# Altium footprint library PSU_lib.PcbLib: 108 footprints (part 5 of 7)
Each footprint in its own frame and in the unit in brackets; x right, y up, seen from the top. Pads: shape width x height; smd on the part's side, far side on the other; paste and mask are expansions set on the pad; w line width, h text height; cw(c..) or ccw(c..) is an arc to the next point about the centre after c.
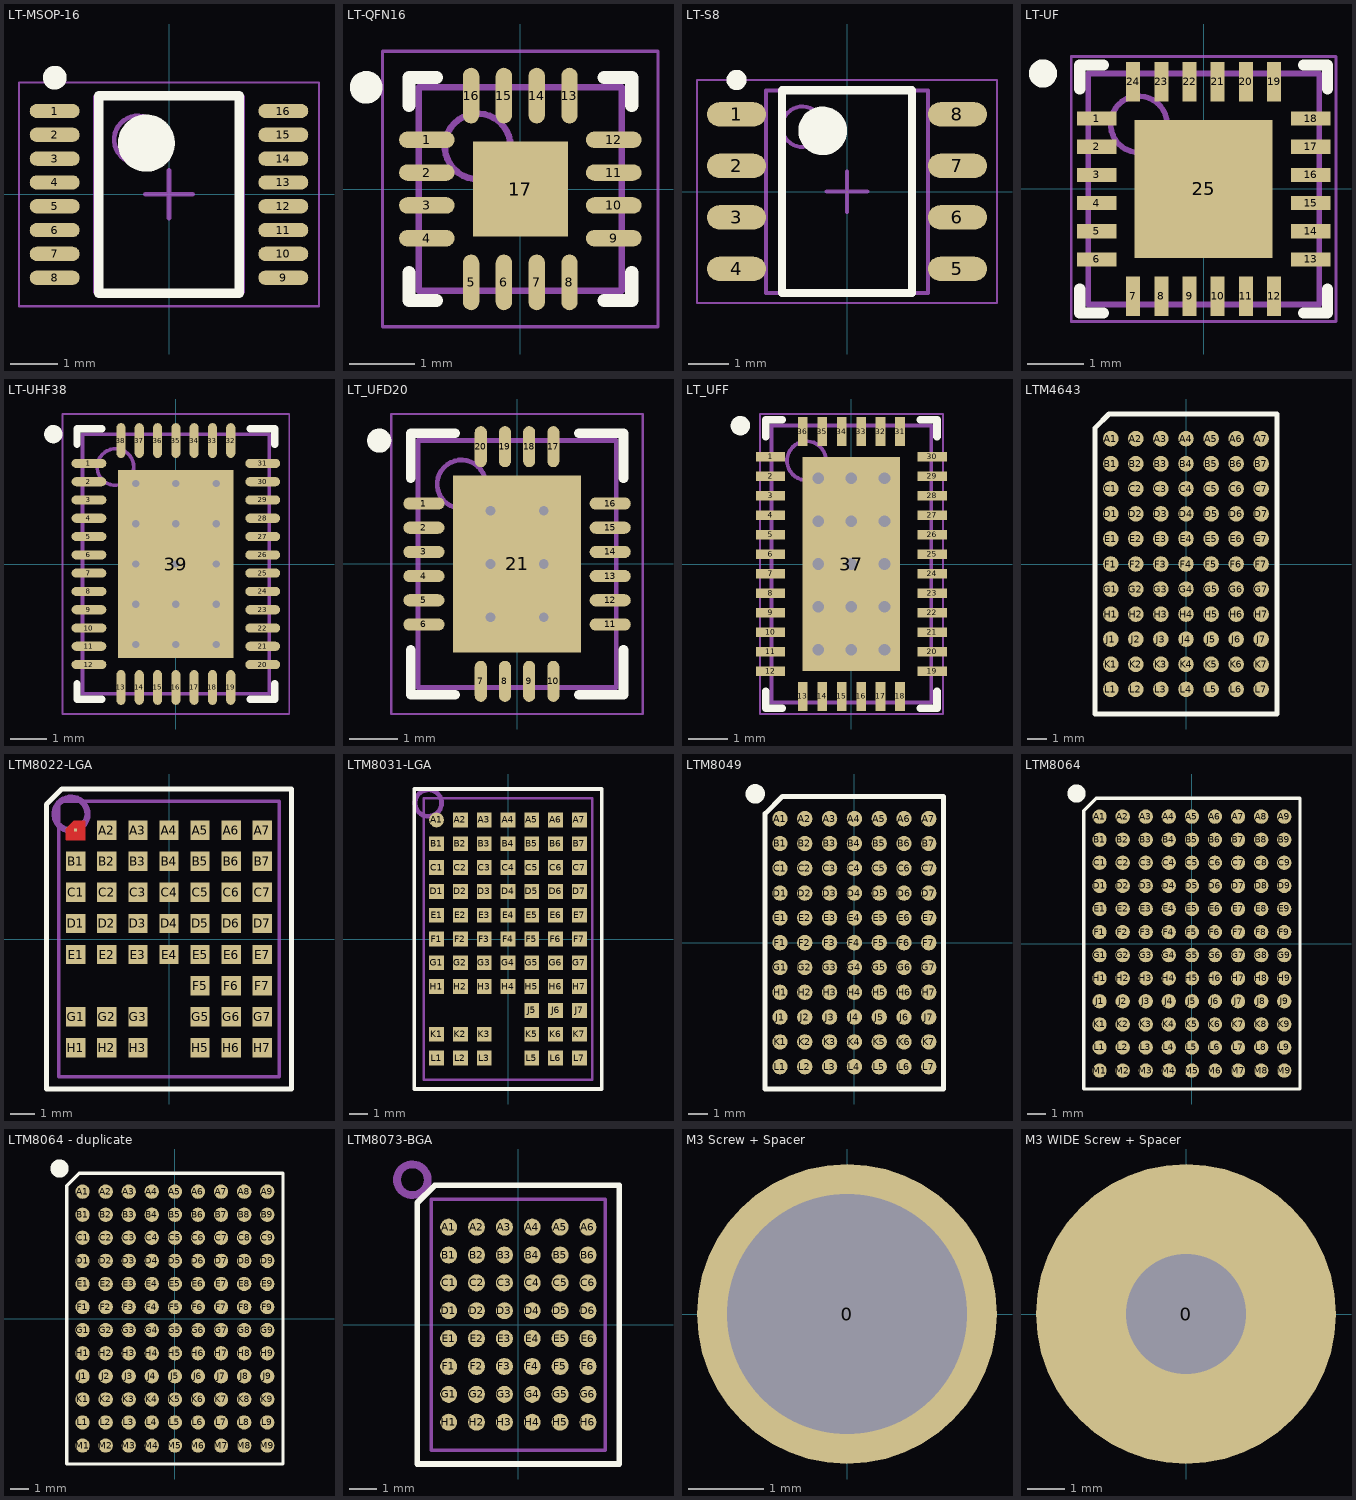
[diagram p4: the footprints below, top view; thin cyan lines are the x and y axes]

## LT-MSOP-16 [mm] "TSSOP, 16-Leads, Body 4,04x3,00mm, Pitch 0,50mm, IPC Medium Density"
height 1.1
pads (16):
  oval 1.05x0.3 smd: 1(-2.4,1.75) 2(-2.4,1.25) 3(-2.4,0.75) 4(-2.4,0.25) 5(-2.4,-0.25) 6(-2.4,-0.75) 7(-2.4,-1.25) 8(-2.4,-1.75) 9(2.4,-1.75) 10(2.4,-1.25) 11(2.4,-0.75) 12(2.4,-0.25) 13(2.4,0.25) 14(2.4,0.75) 15(2.4,1.25) 16(2.4,1.75)
Top Overlay:
  circle w0.25: c-2.4,2.45 r0.125
  circle w0.6: c-0.475,1.075 r0.3
  lines w0.2: -1.475,-2.075 -1.475,2.075 1.475,2.075 1.475,-2.075 -1.475,-2.075
Mechanical 13:
  circle w0.1: c-0.65,1.15 r0.5
  lines w0.1: -1.55,-2.05 -1.55,2.05 1.55,2.05 1.55,-2.05 -1.55,-2.05
Mechanical 15:
  lines w0.05: -3.15,-2.35 -3.15,2.35 3.15,2.35 3.15,-2.35 -3.15,-2.35
  lines w0.1: -0.5,0 0.5,0 ; 0,-0.5 0,0.5
3D body: height 1.1, standoff 0.05, extent -1.55,-2.05 1.55,2.05

## LT-QFN16 [mm] "QFN, 16-Leads, Body 3,00x3,00mm, Pitch 0,50mm, Thermal Pad 1,45x1,45mm, IPC Medium Density"
height 0.8
pads (17):
  oval 0.85x0.25 smd: 1(-1.425,0.75) 2(-1.425,0.25) 3(-1.425,-0.25) 4(-1.425,-0.75) 9(1.425,-0.75) 10(1.425,-0.25) 11(1.425,0.25) 12(1.425,0.75)
  oval 0.25x0.85 smd: 5(-0.75,-1.425) 6(-0.25,-1.425) 7(0.25,-1.425) 8(0.75,-1.425) 13(0.75,1.425) 14(0.25,1.425) 15(-0.25,1.425) 16(-0.75,1.425)
  rect 1.45x1.45 smd: 17(0,0)
Top Overlay:
  circle w0.25: c-2.35,1.55 r0.125
  lines w0.2: -1.7,-1.275 -1.7,-1.7 -1.275,-1.7 ; -1.7,1.275 -1.7,1.7 -1.275,1.7 ; 1.275,-1.7 1.7,-1.7 1.7,-1.275 ; 1.275,1.7 1.7,1.7 1.7,1.275
Mechanical 13:
  circle w0.1: c-0.65,0.65 r0.5
  lines w0.1: -1.55,-1.55 1.55,-1.55 1.55,1.55 -1.55,1.55 -1.55,-1.55
Mechanical 15:
  lines w0.05: -2.1,-2.1 2.1,-2.1 2.1,2.1 -2.1,2.1 -2.1,-2.1
  lines w0.1: -0.5,0 0.5,0 ; 0,-0.5 0,0.5
3D body "QFN50P300X300X80_HS-17N.step": height 0.8, standoff 0, extent -1.551,-1.551 1.551,1.551

## LT-S8 [mm] "SOIC, 8-Leads, Body 4,90x3,90mm, Pitch 1,27mm, IPC Medium Density"
height 1.75
pads (8):
  oval 1.45x0.6 smd: 1(-2.725,1.905) 2(-2.725,0.635) 3(-2.725,-0.635) 4(-2.725,-1.905) 5(2.725,-1.905) 6(2.725,-0.635) 7(2.725,0.635) 8(2.725,1.905)
Top Overlay:
  circle w0.6: c-0.6,1.5 r0.3
  circle w0.25: c-2.725,2.755 r0.125
  lines w0.2: -1.6,-2.5 1.6,-2.5 1.6,2.5 -1.6,2.5 -1.6,-2.5
Mechanical 13:
  circle w0.1: c-1.1,1.6 r0.5
  lines w0.1: -2,-2.5 2,-2.5 2,2.5 -2,2.5 -2,-2.5
Mechanical 15:
  lines w0.05: -3.7,-2.75 3.7,-2.75 3.7,2.75 -3.7,2.75 -3.7,-2.75
  lines w0.1: -0.5,0 0.5,0 ; 0,-0.5 0,0.5
3D body "SOIC127P600X175-8N.step": height 1.75, standoff 0, extent -3,-2.5 3,2.5

## LT-UF [mm] "4x4 QFN-24"
height 0.8
pads (25):
  rect 0.7x0.25 smd: 1(-1.9,1.25) 2(-1.9,0.75) 3(-1.9,0.25) 4(-1.9,-0.25) 5(-1.9,-0.75) 6(-1.9,-1.25) 13(1.9,-1.25) 14(1.9,-0.75) 15(1.9,-0.25) 16(1.9,0.25) 17(1.9,0.75) 18(1.9,1.25)
  rect 0.25x0.7 smd: 7(-1.25,-1.9) 8(-0.75,-1.9) 9(-0.25,-1.9) 10(0.25,-1.9) 11(0.75,-1.9) 12(1.25,-1.9) 19(1.25,1.9) 20(0.75,1.9) 21(0.25,1.9) 22(-0.25,1.9) 23(-0.75,1.9) 24(-1.25,1.9)
  rect 2.45x2.45 smd: 25(0,0)
Top Overlay:
  circle w0.25: c-2.85,2.05 r0.125
  lines w0.2: -2.2,-1.775 -2.2,-2.2 -1.775,-2.2 ; -2.2,1.775 -2.2,2.2 -1.775,2.2 ; 1.775,-2.2 2.2,-2.2 2.2,-1.775 ; 1.775,2.2 2.2,2.2 2.2,1.775
Mechanical 13:
  circle w0.1: c-1.15,1.15 r0.5
  lines w0.1: -2.05,-2.05 -2.05,2.05 2.05,2.05 2.05,-2.05 -2.05,-2.05
Mechanical 15:
  lines w0.05: -2.35,-2.35 -2.35,2.35 2.35,2.35 2.35,-2.35 -2.35,-2.35
  lines w0.1: -0.5,0 0.5,0 ; 0,-0.5 0,0.5
3D body "QFN50P400X400X80_HS-25L.step": height 0.8, standoff 0, extent -2.06,-2.06 2.06,2.06

## LT-UHF38 [mm] "QFN, 38-Leads, Body 5,00x7,00mm, Pitch 0,50mm, Thermal Pad 3,15x5,15mm, IPC Medium Density"
height 0.8
pads (39):
  oval 0.95x0.25 smd: 1(-2.375,2.75) 2(-2.375,2.25) 3(-2.375,1.75) 4(-2.375,1.25) 5(-2.375,0.75) 6(-2.375,0.25) 7(-2.375,-0.25) 8(-2.375,-0.75) 9(-2.375,-1.25) 10(-2.375,-1.75) 11(-2.375,-2.25) 12(-2.375,-2.75) 20(2.375,-2.75) 21(2.375,-2.25) 22(2.375,-1.75) 23(2.375,-1.25) 24(2.375,-0.75) 25(2.375,-0.25) 26(2.375,0.25) 27(2.375,0.75) 28(2.375,1.25) 29(2.375,1.75) 30(2.375,2.25) 31(2.375,2.75)
  oval 0.25x0.95 smd: 13(-1.5,-3.375) 14(-1,-3.375) 15(-0.5,-3.375) 16(0,-3.375) 17(0.5,-3.375) 18(1,-3.375) 19(1.5,-3.375) 32(1.5,3.375) 33(1,3.375) 34(0.5,3.375) 35(0,3.375) 36(-0.5,3.375) 37(-1,3.375) 38(-1.5,3.375)
  rect 3.15x5.15 smd: 39(0,0)
via -1.1,2.2 diameter 0.5 hole 0.2
via 0,2.2 diameter 0.5 hole 0.2
via 1.1,2.2 diameter 0.5 hole 0.2
via -1.1,1.1 diameter 0.5 hole 0.2
via 0,1.1 diameter 0.5 hole 0.2
via 1.1,1.1 diameter 0.5 hole 0.2
via -1.1,0 diameter 0.5 hole 0.2
via 0,0 diameter 0.5 hole 0.2
via 1.1,0 diameter 0.5 hole 0.2
via -1.1,-1.1 diameter 0.5 hole 0.2
via 0,-1.1 diameter 0.5 hole 0.2
via 1.1,-1.1 diameter 0.5 hole 0.2
via -1.1,-2.2 diameter 0.5 hole 0.2
via 0,-2.2 diameter 0.5 hole 0.2
via 1.1,-2.2 diameter 0.5 hole 0.2
Top Overlay:
  circle w0.25: c-3.35,3.55 r0.125
  lines w0.2: -2.7,-3.275 -2.7,-3.7 -2.025,-3.7 ; -2.7,3.275 -2.7,3.7 -2.025,3.7 ; 2.025,-3.7 2.7,-3.7 2.7,-3.275 ; 2.025,3.7 2.7,3.7 2.7,3.275
Mechanical 13:
  circle w0.1: c-1.65,2.65 r0.5
  lines w0.1: -2.55,-3.55 -2.55,3.55 2.55,3.55 2.55,-3.55 -2.55,-3.55
Mechanical 15:
  lines w0.05: -3.1,-4.1 -3.1,4.1 3.1,4.1 3.1,-4.1 -3.1,-4.1
  lines w0.1: -0.5,0 0.5,0 ; 0,-0.5 0,0.5
3D body: height 0.8, standoff 0.01, extent -2.55,-3.55 2.55,3.55

## LT_UFD20 [mm] "QFN, 20-Leads, Body 4,00x5,00mm, Pitch 0,50mm, Thermal Pad 2,65x3,65mm, IPC Medium Density"
height 0.8
pads (21):
  oval 0.85x0.25 smd: 1(-1.925,1.25) 2(-1.925,0.75) 3(-1.925,0.25) 4(-1.925,-0.25) 5(-1.925,-0.75) 6(-1.925,-1.25) 11(1.925,-1.25) 12(1.925,-0.75) 13(1.925,-0.25) 14(1.925,0.25) 15(1.925,0.75) 16(1.925,1.25)
  oval 0.25x0.85 smd: 7(-0.75,-2.425) 8(-0.25,-2.425) 9(0.25,-2.425) 10(0.75,-2.425) 17(0.75,2.425) 18(0.25,2.425) 19(-0.25,2.425) 20(-0.75,2.425)
  rect 2.65x3.65 smd: 21(0,0)
via 0.55,-1.1 diameter 0.5 hole 0.2
via -0.55,-1.1 diameter 0.5 hole 0.2
via 0.55,0 diameter 0.5 hole 0.2
via -0.55,0 diameter 0.5 hole 0.2
via 0.55,1.1 diameter 0.5 hole 0.2
via -0.55,1.1 diameter 0.5 hole 0.2
Top Overlay:
  circle w0.25: c-2.85,2.55 r0.125
  lines w0.2: -2.2,-1.775 -2.2,-2.7 -1.275,-2.7 ; -2.2,1.775 -2.2,2.7 -1.275,2.7 ; 1.275,-2.7 2.2,-2.7 2.2,-1.775 ; 1.275,2.7 2.2,2.7 2.2,1.775
Mechanical 13:
  circle w0.1: c-1.15,1.65 r0.5
  lines w0.1: -2.05,-2.55 2.05,-2.55 2.05,2.55 -2.05,2.55 -2.05,-2.55
Mechanical 15:
  lines w0.05: -2.6,-3.1 2.6,-3.1 2.6,3.1 -2.6,3.1 -2.6,-3.1
  lines w0.1: -0.5,0 0.5,0 ; 0,-0.5 0,0.5
3D body: height 0.8, standoff 0.01, extent -2.05,-2.55 2.05,2.55

## LT_UFF [mm] "QFN, 36-Leads, Body 4.00x7.00mm, Pitch 0.50mm, Thermal Pad 2.50x5.50mm"
height 0.8
pads (37):
  rect 0.75x0.25 smd: 1(-2.075,2.75) 2(-2.075,2.25) 3(-2.075,1.75) 4(-2.075,1.25) 5(-2.075,0.75) 6(-2.075,0.25) 7(-2.075,-0.25) 8(-2.075,-0.75) 9(-2.075,-1.25) 10(-2.075,-1.75) 11(-2.075,-2.25) 12(-2.075,-2.75) 19(2.075,-2.75) 20(2.075,-2.25) 21(2.075,-1.75) 22(2.075,-1.25) 23(2.075,-0.75) 24(2.075,-0.25) 25(2.075,0.25) 26(2.075,0.75) 27(2.075,1.25) 28(2.075,1.75) 29(2.075,2.25) 30(2.075,2.75)
  rect 0.25x0.75 smd: 13(-1.25,-3.4) 14(-0.75,-3.4) 15(-0.25,-3.4) 16(0.25,-3.4) 17(0.75,-3.4) 18(1.25,-3.4) 31(1.25,3.4) 32(0.75,3.4) 33(0.25,3.4) 34(-0.25,3.4) 35(-0.75,3.4) 36(-1.25,3.4)
  rect 2.5x5.5 smd: 37(0,0)
via 0,2.2 diameter 0.6 hole 0.3
via 0,1.1 diameter 0.6 hole 0.3
via 0,0 diameter 0.6 hole 0.3
via 0,-1.1 diameter 0.6 hole 0.3
via 0,-2.2 diameter 0.6 hole 0.3
via 0.85,-2.2 diameter 0.6 hole 0.3
via -0.85,-2.2 diameter 0.6 hole 0.3
via 0.85,-1.1 diameter 0.6 hole 0.3
via -0.85,-1.1 diameter 0.6 hole 0.3
via 0.85,0 diameter 0.6 hole 0.3
via -0.85,0 diameter 0.6 hole 0.3
via 0.85,1.1 diameter 0.6 hole 0.3
via -0.85,1.1 diameter 0.6 hole 0.3
via 0.85,2.2 diameter 0.6 hole 0.3
via -0.85,2.2 diameter 0.6 hole 0.3
Top Overlay:
  circle w0.25: c-2.85,3.55 r0.125
  lines w0.2: -2.2,-3.275 -2.2,-3.7 -1.775,-3.7 ; -2.2,3.275 -2.2,3.7 -1.775,3.7 ; 1.775,-3.7 2.2,-3.7 2.2,-3.275 ; 1.775,3.7 2.2,3.7 2.2,3.275
Mechanical 13:
  circle w0.1: c-1.15,2.65 r0.5
  lines w0.1: -2.05,-3.55 2.05,-3.55 2.05,3.55 -2.05,3.55 -2.05,-3.55
Mechanical 15:
  lines w0.05: -2.35,-3.85 2.35,-3.85 2.35,3.85 -2.35,3.85 -2.35,-3.85
  lines w0.1: -0.5,0 0.5,0 ; 0,-0.5 0,0.5
3D body: height 0.8, standoff 0.05, extent -2.05,-3.55 2.05,3.55

## LTM4643 [mil]
pads (77):
  round 31 smd: A1(-150,250) A2(-100,250) A3(-50,250) A4(0,250) A5(50,250) A6(100,250) A7(150,250) B1(-150,200) B2(-100,200) B3(-50,200) B4(0,200) B5(50,200) B6(100,200) B7(150,200) C1(-150,150) C2(-100,150) C3(-50,150) C4(0,150) C5(50,150) C6(100,150) C7(150,150) D1(-150,100) D2(-100,100) D3(-50,100) D4(0,100) D5(50,100) D6(100,100) D7(150,100) E1(-150,50) E2(-100,50) E3(-50,50) E4(0,50) E5(50,50) E6(100,50) E7(150,50) F1(-150,0) F2(-100,0) F3(-50,0) F4(0,0) F5(50,0) F6(100,0) F7(150,0) G1(-150,-50) G2(-100,-50) G3(-50,-50) G4(0,-50) G5(50,-50) G6(100,-50) G7(150,-50) H1(-150,-100) H2(-100,-100) H3(-50,-100) H4(0,-100) H5(50,-100) H6(100,-100) H7(150,-100) J1(-150,-150) J2(-100,-150) J3(-50,-150) J4(0,-150) J5(50,-150) J6(100,-150) J7(150,-150) K1(-150,-200) K2(-100,-200) K3(-50,-200) K4(0,-200) K5(50,-200) K6(100,-200) K7(150,-200) L1(-150,-250) L2(-100,-250) L3(-50,-250) L4(0,-250) L5(50,-250) L6(100,-250) L7(150,-250)
Top Overlay:
  lines w10: -181.1,-299.21 -181.1,271.65 -153.54,299.21 181.1,299.21 181.1,-299.21 -181.1,-299.21
3D body: height 47.24, standoff 0, extent -173.39,-273.52 -126.37,-226.48
3D body: height 47.24, standoff 0, extent -123.39,-273.52 -76.37,-226.48
3D body: height 47.24, standoff 0, extent -73.39,-273.52 -26.37,-226.48
3D body: height 47.24, standoff 0, extent -23.39,-273.52 23.63,-226.48
3D body: height 47.24, standoff 0, extent 26.61,-273.52 73.63,-226.48
3D body: height 47.24, standoff 0, extent 76.61,-273.52 123.63,-226.48
3D body: height 47.24, standoff 0, extent 126.61,-273.52 173.63,-226.48
3D body: height 47.24, standoff 0, extent -173.39,-223.52 -126.37,-176.48
3D body: height 47.24, standoff 0, extent -123.39,-223.52 -76.37,-176.48
3D body: height 47.24, standoff 0, extent -73.39,-223.52 -26.37,-176.48
3D body: height 47.24, standoff 0, extent -23.39,-223.52 23.63,-176.48
3D body: height 47.24, standoff 0, extent 26.61,-223.52 73.63,-176.48
3D body: height 47.24, standoff 0, extent 76.61,-223.52 123.63,-176.48
3D body: height 47.24, standoff 0, extent 126.61,-223.52 173.63,-176.48
3D body: height 47.24, standoff 0, extent -173.39,-173.52 -126.37,-126.48
3D body: height 47.24, standoff 0, extent -123.39,-173.52 -76.37,-126.48
3D body: height 47.24, standoff 0, extent -73.39,-173.52 -26.37,-126.48
3D body: height 47.24, standoff 0, extent -23.39,-173.52 23.63,-126.48
3D body: height 47.24, standoff 0, extent 26.61,-173.52 73.63,-126.48
3D body: height 47.24, standoff 0, extent 76.61,-173.52 123.63,-126.48
3D body: height 47.24, standoff 0, extent 126.61,-173.52 173.63,-126.48
3D body: height 47.24, standoff 0, extent -173.39,-123.52 -126.37,-76.48
3D body: height 47.24, standoff 0, extent -123.39,-123.52 -76.37,-76.48
3D body: height 47.24, standoff 0, extent -73.39,-123.52 -26.37,-76.48
3D body: height 47.24, standoff 0, extent -23.39,-123.52 23.63,-76.48
3D body: height 47.24, standoff 0, extent 26.61,-123.52 73.63,-76.48
3D body: height 47.24, standoff 0, extent 76.61,-123.52 123.63,-76.48
3D body: height 47.24, standoff 0, extent 126.61,-123.52 173.63,-76.48
3D body: height 47.24, standoff 0, extent -173.39,-73.52 -126.37,-26.48
3D body: height 47.24, standoff 0, extent -123.39,-73.52 -76.37,-26.48
3D body: height 47.24, standoff 0, extent -73.39,-73.52 -26.37,-26.48
3D body: height 47.24, standoff 0, extent -23.39,-73.52 23.63,-26.48
3D body: height 47.24, standoff 0, extent 26.61,-73.52 73.63,-26.48
3D body: height 47.24, standoff 0, extent 76.61,-73.52 123.63,-26.48
3D body: height 47.24, standoff 0, extent 126.61,-73.52 173.63,-26.48
3D body: height 47.24, standoff 0, extent -173.39,-23.52 -126.37,23.52
3D body: height 47.24, standoff 0, extent -123.39,-23.52 -76.37,23.52
3D body: height 47.24, standoff 0, extent -73.39,-23.52 -26.37,23.52
3D body: height 47.24, standoff 0, extent -23.39,-23.52 23.63,23.52
3D body: height 47.24, standoff 0, extent 26.61,-23.52 73.63,23.52
3D body: height 47.24, standoff 0, extent 76.61,-23.52 123.63,23.52
3D body: height 47.24, standoff 0, extent 126.61,-23.52 173.63,23.52
3D body: height 47.24, standoff 0, extent -173.39,26.48 -126.37,73.52
3D body: height 47.24, standoff 0, extent -123.39,26.48 -76.37,73.52
3D body: height 47.24, standoff 0, extent -73.39,26.48 -26.37,73.52
3D body: height 47.24, standoff 0, extent -23.39,26.48 23.63,73.52
3D body: height 47.24, standoff 0, extent 26.61,26.48 73.63,73.52
3D body: height 47.24, standoff 0, extent 76.61,26.48 123.63,73.52
3D body: height 47.24, standoff 0, extent 126.61,26.48 173.63,73.52
3D body: height 47.24, standoff 0, extent -173.39,76.48 -126.37,123.52
3D body: height 47.24, standoff 0, extent -123.39,76.48 -76.37,123.52
3D body: height 47.24, standoff 0, extent -73.39,76.48 -26.37,123.52
3D body: height 47.24, standoff 0, extent -23.39,76.48 23.63,123.52
3D body: height 47.24, standoff 0, extent 26.61,76.48 73.63,123.52
3D body: height 47.24, standoff 0, extent 76.61,76.48 123.63,123.52
3D body: height 47.24, standoff 0, extent 126.61,76.48 173.63,123.52
3D body: height 47.24, standoff 0, extent -173.39,126.48 -126.37,173.52
3D body: height 47.24, standoff 0, extent -123.39,126.48 -76.37,173.52
3D body: height 47.24, standoff 0, extent -73.39,126.48 -26.37,173.52
3D body: height 47.24, standoff 0, extent -23.39,126.48 23.63,173.52
3D body: height 47.24, standoff 0, extent 26.61,126.48 73.63,173.52
3D body: height 47.24, standoff 0, extent 76.61,126.48 123.63,173.52
3D body: height 47.24, standoff 0, extent 126.61,126.48 173.63,173.52
3D body: height 47.24, standoff 0, extent -173.39,176.48 -126.37,223.52
3D body: height 47.24, standoff 0, extent -123.39,176.48 -76.37,223.52
3D body: height 47.24, standoff 0, extent -73.39,176.48 -26.37,223.52
3D body: height 47.24, standoff 0, extent -23.39,176.48 23.63,223.52
3D body: height 47.24, standoff 0, extent 26.61,176.48 73.63,223.52
3D body: height 47.24, standoff 0, extent 76.61,176.48 123.63,223.52
3D body: height 47.24, standoff 0, extent 126.61,176.48 173.63,223.52
3D body: height 47.24, standoff 0, extent 126.61,226.48 173.63,273.52
3D body: height 47.24, standoff 0, extent 76.61,226.48 123.63,273.52
3D body: height 47.24, standoff 0, extent 26.61,226.48 73.63,273.52
3D body: height 47.24, standoff 0, extent -23.39,226.48 23.63,273.52
3D body: height 47.24, standoff 0, extent -73.39,226.48 -26.37,273.52
3D body: height 47.24, standoff 0, extent -123.39,226.48 -76.37,273.52
3D body: height 47.24, standoff 0, extent -173.39,226.48 -126.37,273.52
3D body: height 103.15, standoff 27.56, extent -180,-295 180,295

## LTM8022-LGA [mil]
pads (50):
  rect 5x5 smd paste-3.5 mask-3: A1(-150,175)
  rect 31x31 smd paste-3.5 mask-3: A2(-100,175) A3(-50,175) A4(0,175) A5(50,175) A6(100,175) A7(150,175) B1(-150,125) B2(-100,125) B3(-50,125) B4(0,125) B5(50,125) B6(100,125) B7(150,125) C1(-150,75) C2(-100,75) C3(-50,75) C4(0,75) C5(50,75) C6(100,75) C7(150,75) D1(-150,25) D2(-100,25) D3(-50,25) D4(0,25) D5(50,25) D6(100,25) D7(150,25) E1(-150,-25) E2(-100,-25) E3(-50,-25) E4(0,-25) E5(50,-25) E6(100,-25) E7(150,-25) F5(50,-75) F6(100,-75) F7(150,-75) G1(-150,-125) G2(-100,-125) G3(-50,-125) G5(50,-125) G6(100,-125) G7(150,-125) H1(-150,-175) H2(-100,-175) H3(-50,-175) H5(50,-175) H6(100,-175) H7(150,-175)
Top Layer:
  region: -165.5,159.5 -134.5,159.5 -134.5,190.5 -152.5,190.5 -165.5,177.5
  lines w0.39: -165.5,159.5 -134.5,159.5 -134.5,190.5 -152.5,190.5 -165.5,177.5 -165.5,159.5
Top Overlay:
  lines w8: -196.85,-241.14 196.85,-241.14 196.85,241.14 -172.24,241.14 -196.85,216.54 -196.85,-241.14
Mechanical 1:
  circle w10: c-157.48,200.79 r26.41
Mechanical 16:
  lines w5: -177.17,-221.46 -177.17,221.46 177.17,221.46 177.17,-221.46 -177.17,-221.46

## LTM8031-LGA [mil]
pads (71):
  round 31 smd: A1(-150,250)
  rect 31x31 smd: A2(-100,250) A3(-50,250) A4(0,250) A5(50,250) A6(100,250) A7(150,250) B1(-150,200) B2(-100,200) B3(-50,200) B4(0,200) B5(50,200) B6(100,200) B7(150,200) C1(-150,150) C2(-100,150) C3(-50,150) C4(0,150) C5(50,150) C6(100,150) C7(150,150) D1(-150,100) D2(-100,100) D3(-50,100) D4(0,100) D5(50,100) D6(100,100) D7(150,100) E1(-150,50) E2(-100,50) E3(-50,50) E4(0,50) E5(50,50) E6(100,50) E7(150,50) F1(-150,0) F2(-100,0) F3(-50,0) F4(0,0) F5(50,0) F6(100,0) F7(150,0) G1(-150,-50) G2(-100,-50) G3(-50,-50) G4(0,-50) G5(50,-50) G6(100,-50) G7(150,-50) H1(-150,-100) H2(-100,-100) H3(-50,-100) H4(0,-100) H5(50,-100) H6(100,-100) H7(150,-100) J5(50,-150) J6(100,-150) J7(150,-150) K1(-150,-200) K2(-100,-200) K3(-50,-200) K5(50,-200) K6(100,-200) K7(150,-200) L1(-150,-250) L2(-100,-250) L3(-50,-250) L5(50,-250) L6(100,-250) L7(150,-250)
Top Overlay:
  lines w8: -196.85,-314.96 196.85,-314.96 196.85,314.96 -196.85,314.96 -196.85,-314.96
Mechanical 1:
  circle w10: c-167.32,285.43 r27.84
Mechanical 16:
  lines w5: -177.17,-295.28 -177.17,295.28 177.17,295.28 177.17,-295.28 -177.17,-295.28
3D body: height 118.11, standoff 0, extent -177.17,-295.28 177.17,295.28

## LTM8049 [mil]
pads (77):
  round 31 smd: A1(-150,250) A2(-100,250) A3(-50,250) A4(0,250) A5(50,250) A6(100,250) A7(150,250) B1(-150,200) B2(-100,200) B3(-50,200) B4(0,200) B5(50,200) B6(100,200) B7(150,200) C1(-150,150) C2(-100,150) C3(-50,150) C4(0,150) C5(50,150) C6(100,150) C7(150,150) D1(-150,100) D2(-100,100) D3(-50,100) D4(0,100) D5(50,100) D6(100,100) D7(150,100) E1(-150,50) E2(-100,50) E3(-50,50) E4(0,50) E5(50,50) E6(100,50) E7(150,50) F1(-150,0) F2(-100,0) F3(-50,0) F4(0,0) F5(50,0) F6(100,0) F7(150,0) G1(-150,-50) G2(-100,-50) G3(-50,-50) G4(0,-50) G5(50,-50) G6(100,-50) G7(150,-50) H1(-150,-100) H2(-100,-100) H3(-50,-100) H4(0,-100) H5(50,-100) H6(100,-100) H7(150,-100) J1(-150,-150) J2(-100,-150) J3(-50,-150) J4(0,-150) J5(50,-150) J6(100,-150) J7(150,-150) K1(-150,-200) K2(-100,-200) K3(-50,-200) K4(0,-200) K5(50,-200) K6(100,-200) K7(150,-200) L1(-150,-250) L2(-100,-250) L3(-50,-250) L4(0,-250) L5(50,-250) L6(100,-250) L7(150,-250)
Top Overlay:
  circle w19.68: c-200,300 r9.84
  lines w10: -180,-295 -180,260 -145,295 180,295 180,-295 -180,-295
3D body: height 47.24, standoff 0, extent -23.39,226.48 23.63,273.52
3D body: height 47.24, standoff 0, extent 26.61,226.48 73.63,273.52
3D body: height 47.24, standoff 0, extent 76.61,226.48 123.63,273.52
3D body: height 47.24, standoff 0, extent 126.61,226.48 173.63,273.52
3D body: height 47.24, standoff 0, extent -73.39,226.48 -26.37,273.52
3D body: height 47.24, standoff 0, extent -123.39,226.48 -76.37,273.52
3D body: height 47.24, standoff 0, extent -173.39,226.48 -126.37,273.52
3D body: height 47.24, standoff 0, extent -23.39,176.48 23.63,223.52
3D body: height 47.24, standoff 0, extent 26.61,176.48 73.63,223.52
3D body: height 47.24, standoff 0, extent 76.61,176.48 123.63,223.52
3D body: height 47.24, standoff 0, extent 126.61,176.48 173.63,223.52
3D body: height 47.24, standoff 0, extent -73.39,176.48 -26.37,223.52
3D body: height 47.24, standoff 0, extent -123.39,176.48 -76.37,223.52
3D body: height 47.24, standoff 0, extent -173.39,176.48 -126.37,223.52
3D body: height 47.24, standoff 0, extent -23.39,126.48 23.63,173.52
3D body: height 47.24, standoff 0, extent 26.61,126.48 73.63,173.52
3D body: height 47.24, standoff 0, extent 76.61,126.48 123.63,173.52
3D body: height 47.24, standoff 0, extent 126.61,126.48 173.63,173.52
3D body: height 47.24, standoff 0, extent -73.39,126.48 -26.37,173.52
3D body: height 47.24, standoff 0, extent -123.39,126.48 -76.37,173.52
3D body: height 47.24, standoff 0, extent -173.39,126.48 -126.37,173.52
3D body: height 47.24, standoff 0, extent -23.39,76.48 23.63,123.52
3D body: height 47.24, standoff 0, extent 26.61,76.48 73.63,123.52
3D body: height 47.24, standoff 0, extent 76.61,76.48 123.63,123.52
3D body: height 47.24, standoff 0, extent 126.61,76.48 173.63,123.52
3D body: height 47.24, standoff 0, extent -73.39,76.48 -26.37,123.52
3D body: height 47.24, standoff 0, extent -123.39,76.48 -76.37,123.52
3D body: height 47.24, standoff 0, extent -173.39,76.48 -126.37,123.52
3D body: height 47.24, standoff 0, extent -23.39,26.48 23.63,73.52
3D body: height 47.24, standoff 0, extent 26.61,26.48 73.63,73.52
3D body: height 47.24, standoff 0, extent 76.61,26.48 123.63,73.52
3D body: height 47.24, standoff 0, extent 126.61,26.48 173.63,73.52
3D body: height 47.24, standoff 0, extent -73.39,26.48 -26.37,73.52
3D body: height 47.24, standoff 0, extent -123.39,26.48 -76.37,73.52
3D body: height 47.24, standoff 0, extent -173.39,26.48 -126.37,73.52
3D body: height 47.24, standoff 0, extent -23.39,-23.52 23.63,23.52
3D body: height 47.24, standoff 0, extent 26.61,-23.52 73.63,23.52
3D body: height 47.24, standoff 0, extent 76.61,-23.52 123.63,23.52
3D body: height 47.24, standoff 0, extent 126.61,-23.52 173.63,23.52
3D body: height 47.24, standoff 0, extent -73.39,-23.52 -26.37,23.52
3D body: height 47.24, standoff 0, extent -123.39,-23.52 -76.37,23.52
3D body: height 47.24, standoff 0, extent -173.39,-23.52 -126.37,23.52
3D body: height 47.24, standoff 0, extent -23.39,-73.52 23.63,-26.48
3D body: height 47.24, standoff 0, extent 26.61,-73.52 73.63,-26.48
3D body: height 47.24, standoff 0, extent 76.61,-73.52 123.63,-26.48
3D body: height 47.24, standoff 0, extent 126.61,-73.52 173.63,-26.48
3D body: height 47.24, standoff 0, extent -73.39,-73.52 -26.37,-26.48
3D body: height 47.24, standoff 0, extent -123.39,-73.52 -76.37,-26.48
3D body: height 47.24, standoff 0, extent -173.39,-73.52 -126.37,-26.48
3D body: height 47.24, standoff 0, extent -23.39,-123.52 23.63,-76.48
3D body: height 47.24, standoff 0, extent 26.61,-123.52 73.63,-76.48
3D body: height 47.24, standoff 0, extent 76.61,-123.52 123.63,-76.48
3D body: height 47.24, standoff 0, extent 126.61,-123.52 173.63,-76.48
3D body: height 47.24, standoff 0, extent -73.39,-123.52 -26.37,-76.48
3D body: height 47.24, standoff 0, extent -123.39,-123.52 -76.37,-76.48
3D body: height 47.24, standoff 0, extent -173.39,-123.52 -126.37,-76.48
3D body: height 47.24, standoff 0, extent -23.39,-173.52 23.63,-126.48
3D body: height 47.24, standoff 0, extent 26.61,-173.52 73.63,-126.48
3D body: height 47.24, standoff 0, extent 76.61,-173.52 123.63,-126.48
3D body: height 47.24, standoff 0, extent 126.61,-173.52 173.63,-126.48
3D body: height 47.24, standoff 0, extent -73.39,-173.52 -26.37,-126.48
3D body: height 47.24, standoff 0, extent -123.39,-173.52 -76.37,-126.48
3D body: height 47.24, standoff 0, extent -173.39,-173.52 -126.37,-126.48
3D body: height 47.24, standoff 0, extent -23.39,-223.52 23.63,-176.48
3D body: height 47.24, standoff 0, extent 26.61,-223.52 73.63,-176.48
3D body: height 47.24, standoff 0, extent 76.61,-223.52 123.63,-176.48
3D body: height 47.24, standoff 0, extent 126.61,-223.52 173.63,-176.48
3D body: height 47.24, standoff 0, extent -73.39,-223.52 -26.37,-176.48
3D body: height 47.24, standoff 0, extent -123.39,-223.52 -76.37,-176.48
3D body: height 47.24, standoff 0, extent -173.39,-223.52 -126.37,-176.48
3D body: height 47.24, standoff 0, extent -23.39,-273.52 23.63,-226.48
3D body: height 47.24, standoff 0, extent 26.61,-273.52 73.63,-226.48
3D body: height 47.24, standoff 0, extent 76.61,-273.52 123.63,-226.48
3D body: height 47.24, standoff 0, extent 126.61,-273.52 173.63,-226.48
3D body: height 47.24, standoff 0, extent -73.39,-273.52 -26.37,-226.48
3D body: height 47.24, standoff 0, extent -123.39,-273.52 -76.37,-226.48
3D body: height 47.24, standoff 0, extent -173.39,-273.52 -126.37,-226.48
3D body: height 103.15, standoff 27.56, extent -180,-295 180,295

## LTM8064 [mil]
pads (108):
  round 31 smd: A1(-200,275) A2(-150,275) A3(-100,275) A4(-50,275) A5(0,275) A6(50,275) A7(100,275) A8(150,275) A9(200,275) B1(-200,225) B2(-150,225) B3(-100,225) B4(-50,225) B5(0,225) B6(50,225) B7(100,225) B8(150,225) B9(200,225) C1(-200,175) C2(-150,175) C3(-100,175) C4(-50,175) C5(0,175) C6(50,175) C7(100,175) C8(150,175) C9(200,175) D1(-200,125) D2(-150,125) D3(-100,125) D4(-50,125) D5(0,125) D6(50,125) D7(100,125) D8(150,125) D9(200,125) E1(-200,75) E2(-150,75) E3(-100,75) E4(-50,75) E5(0,75) E6(50,75) E7(100,75) E8(150,75) E9(200,75) F1(-200,25) F2(-150,25) F3(-100,25) F4(-50,25) F5(0,25) F6(50,25) F7(100,25) F8(150,25) F9(200,25) G1(-200,-25) G2(-150,-25) G3(-100,-25) G4(-50,-25) G5(0,-25) G6(50,-25) G7(100,-25) G8(150,-25) G9(200,-25) H1(-200,-75) H2(-150,-75) H3(-100,-75) H4(-50,-75) H5(0,-75) H6(50,-75) H7(100,-75) H8(150,-75) H9(200,-75) J1(-200,-125) J2(-150,-125) J3(-100,-125) J4(-50,-125) J5(0,-125) J6(50,-125) J7(100,-125) J8(150,-125) J9(200,-125) K1(-200,-175) K2(-150,-175) K3(-100,-175) K4(-50,-175) K5(0,-175) K6(50,-175) K7(100,-175) K8(150,-175) K9(200,-175) L1(-200,-225) L2(-150,-225) L3(-100,-225) L4(-50,-225) L5(0,-225) L6(50,-225) L7(100,-225) L8(150,-225) L9(200,-225) M1(-200,-275) M2(-150,-275) M3(-100,-275) M4(-50,-275) M5(0,-275) M6(50,-275) M7(100,-275) M8(150,-275) M9(200,-275)
Top Overlay:
  circle w19.68: c-250,325 r9.84
  lines w7: -234.25,-314.96 -234.25,287.66 -206.95,314.96 234.25,314.96 234.25,-314.96 -234.25,-314.96
3D body: height 204.72, standoff 27.56, extent -235,-315 235,315
3D body: height 47.24, standoff 0, extent -223.39,-298.51 -176.37,-251.47
3D body: height 47.24, standoff 0, extent -173.39,-298.51 -126.37,-251.47
3D body: height 47.24, standoff 0, extent -123.39,-298.51 -76.37,-251.47
3D body: height 47.24, standoff 0, extent -73.39,-298.51 -26.37,-251.47
3D body: height 47.24, standoff 0, extent -23.39,-298.51 23.63,-251.47
3D body: height 47.24, standoff 0, extent 26.61,-298.51 73.63,-251.47
3D body: height 47.24, standoff 0, extent 76.61,-298.51 123.63,-251.47
3D body: height 47.24, standoff 0, extent 126.61,-298.51 173.63,-251.47
3D body: height 47.24, standoff 0, extent 176.61,-298.51 223.63,-251.47
3D body: height 47.24, standoff 0, extent 176.61,-248.51 223.63,-201.47
3D body: height 47.24, standoff 0, extent 126.61,-248.51 173.63,-201.47
3D body: height 47.24, standoff 0, extent 76.61,-248.51 123.63,-201.47
3D body: height 47.24, standoff 0, extent 26.61,-248.51 73.63,-201.47
3D body: height 47.24, standoff 0, extent -23.39,-248.51 23.63,-201.47
3D body: height 47.24, standoff 0, extent -73.39,-248.51 -26.37,-201.47
3D body: height 47.24, standoff 0, extent -123.39,-248.51 -76.37,-201.47
3D body: height 47.24, standoff 0, extent -173.39,-248.51 -126.37,-201.47
3D body: height 47.24, standoff 0, extent -223.39,-248.52 -176.37,-201.48
3D body: height 47.24, standoff 0, extent 176.61,-198.51 223.63,-151.47
3D body: height 47.24, standoff 0, extent 126.61,-198.51 173.63,-151.47
3D body: height 47.24, standoff 0, extent 76.61,-198.51 123.63,-151.47
3D body: height 47.24, standoff 0, extent 26.61,-198.51 73.63,-151.47
3D body: height 47.24, standoff 0, extent -23.39,-198.51 23.63,-151.47
3D body: height 47.24, standoff 0, extent -73.39,-198.51 -26.37,-151.47
3D body: height 47.24, standoff 0, extent -123.39,-198.51 -76.37,-151.47
3D body: height 47.24, standoff 0, extent -173.39,-198.51 -126.37,-151.47
3D body: height 47.24, standoff 0, extent -223.39,-198.52 -176.37,-151.48
3D body: height 47.24, standoff 0, extent 176.61,-148.51 223.63,-101.47
3D body: height 47.24, standoff 0, extent 126.61,-148.51 173.63,-101.47
3D body: height 47.24, standoff 0, extent 76.61,-148.51 123.63,-101.47
3D body: height 47.24, standoff 0, extent 26.61,-148.51 73.63,-101.47
3D body: height 47.24, standoff 0, extent -23.39,-148.51 23.63,-101.47
3D body: height 47.24, standoff 0, extent -73.39,-148.51 -26.37,-101.47
3D body: height 47.24, standoff 0, extent -123.39,-148.51 -76.37,-101.47
3D body: height 47.24, standoff 0, extent -173.39,-148.51 -126.37,-101.47
3D body: height 47.24, standoff 0, extent -223.39,-148.52 -176.37,-101.48
3D body: height 47.24, standoff 0, extent 176.61,-98.51 223.63,-51.47
3D body: height 47.24, standoff 0, extent 126.61,-98.51 173.63,-51.47
3D body: height 47.24, standoff 0, extent 76.61,-98.51 123.63,-51.47
3D body: height 47.24, standoff 0, extent 26.61,-98.51 73.63,-51.47
3D body: height 47.24, standoff 0, extent -23.39,-98.51 23.63,-51.47
3D body: height 47.24, standoff 0, extent -73.39,-98.51 -26.37,-51.47
3D body: height 47.24, standoff 0, extent -123.39,-98.51 -76.37,-51.47
3D body: height 47.24, standoff 0, extent -173.39,-98.51 -126.37,-51.47
3D body: height 47.24, standoff 0, extent -223.39,-98.52 -176.37,-51.48
3D body: height 47.24, standoff 0, extent 176.61,-48.51 223.63,-1.47
3D body: height 47.24, standoff 0, extent 126.61,-48.51 173.63,-1.47
3D body: height 47.24, standoff 0, extent 76.61,-48.51 123.63,-1.47
3D body: height 47.24, standoff 0, extent 26.61,-48.51 73.63,-1.47
3D body: height 47.24, standoff 0, extent -23.39,-48.51 23.63,-1.47
3D body: height 47.24, standoff 0, extent -73.39,-48.51 -26.37,-1.47
3D body: height 47.24, standoff 0, extent -123.39,-48.51 -76.37,-1.47
3D body: height 47.24, standoff 0, extent -173.39,-48.51 -126.37,-1.47
3D body: height 47.24, standoff 0, extent -223.39,-48.52 -176.37,-1.48
3D body: height 47.24, standoff 0, extent 176.61,1.49 223.63,48.53
3D body: height 47.24, standoff 0, extent 126.61,1.49 173.63,48.53
3D body: height 47.24, standoff 0, extent 76.61,1.49 123.63,48.53
3D body: height 47.24, standoff 0, extent 26.61,1.49 73.63,48.53
3D body: height 47.24, standoff 0, extent -23.39,1.49 23.63,48.53
3D body: height 47.24, standoff 0, extent -73.39,1.49 -26.37,48.53
3D body: height 47.24, standoff 0, extent -123.39,1.49 -76.37,48.53
3D body: height 47.24, standoff 0, extent -173.39,1.49 -126.37,48.53
3D body: height 47.24, standoff 0, extent -223.39,1.48 -176.37,48.52
3D body: height 47.24, standoff 0, extent 176.61,51.49 223.63,98.53
3D body: height 47.24, standoff 0, extent 126.61,51.49 173.63,98.53
3D body: height 47.24, standoff 0, extent 76.61,51.49 123.63,98.53
3D body: height 47.24, standoff 0, extent 26.61,51.49 73.63,98.53
3D body: height 47.24, standoff 0, extent -23.39,51.49 23.63,98.53
3D body: height 47.24, standoff 0, extent -73.39,51.49 -26.37,98.53
3D body: height 47.24, standoff 0, extent -123.39,51.49 -76.37,98.53
3D body: height 47.24, standoff 0, extent -173.39,51.49 -126.37,98.53
3D body: height 47.24, standoff 0, extent -223.39,51.48 -176.37,98.52
3D body: height 47.24, standoff 0, extent 176.61,101.49 223.63,148.53
3D body: height 47.24, standoff 0, extent 126.61,101.49 173.63,148.53
3D body: height 47.24, standoff 0, extent 76.61,101.49 123.63,148.53
3D body: height 47.24, standoff 0, extent 26.61,101.49 73.63,148.53
3D body: height 47.24, standoff 0, extent -23.39,101.49 23.63,148.53
3D body: height 47.24, standoff 0, extent -73.39,101.49 -26.37,148.53
3D body: height 47.24, standoff 0, extent -123.39,101.49 -76.37,148.53
3D body: height 47.24, standoff 0, extent -173.39,101.49 -126.37,148.53
3D body: height 47.24, standoff 0, extent -223.39,101.48 -176.37,148.52
3D body: height 47.24, standoff 0, extent 176.61,151.49 223.63,198.53
3D body: height 47.24, standoff 0, extent 126.61,151.49 173.63,198.53
3D body: height 47.24, standoff 0, extent 76.61,151.49 123.63,198.53
3D body: height 47.24, standoff 0, extent 26.61,151.49 73.63,198.53
3D body: height 47.24, standoff 0, extent -23.39,151.49 23.63,198.53
3D body: height 47.24, standoff 0, extent -73.39,151.49 -26.37,198.53
3D body: height 47.24, standoff 0, extent -123.39,151.49 -76.37,198.53
3D body: height 47.24, standoff 0, extent -173.39,151.49 -126.37,198.53
3D body: height 47.24, standoff 0, extent -223.39,151.48 -176.37,198.52
3D body: height 47.24, standoff 0, extent 176.61,201.49 223.63,248.53
3D body: height 47.24, standoff 0, extent 126.61,201.49 173.63,248.53
3D body: height 47.24, standoff 0, extent 76.61,201.49 123.63,248.53
3D body: height 47.24, standoff 0, extent 26.61,201.49 73.63,248.53
3D body: height 47.24, standoff 0, extent -23.39,201.49 23.63,248.53
3D body: height 47.24, standoff 0, extent -73.39,201.49 -26.37,248.53
3D body: height 47.24, standoff 0, extent -123.39,201.49 -76.37,248.53
3D body: height 47.24, standoff 0, extent -173.39,201.49 -126.37,248.53
3D body: height 47.24, standoff 0, extent -223.39,201.48 -176.37,248.52
3D body: height 47.24, standoff 0, extent 176.61,251.49 223.63,298.53
3D body: height 47.24, standoff 0, extent 126.61,251.49 173.63,298.53
3D body: height 47.24, standoff 0, extent 76.61,251.49 123.63,298.53
3D body: height 47.24, standoff 0, extent 26.61,251.49 73.63,298.53
3D body: height 47.24, standoff 0, extent -23.39,251.49 23.63,298.53
3D body: height 47.24, standoff 0, extent -73.39,251.49 -26.37,298.53
3D body: height 47.24, standoff 0, extent -123.39,251.49 -76.37,298.53
3D body: height 47.24, standoff 0, extent -173.39,251.49 -126.37,298.53
3D body: height 47.24, standoff 0, extent -223.39,251.48 -176.37,298.52

## LTM8064 - duplicate [mil]
pads (108):
  round 31 smd: A1(-200,275) A2(-150,275) A3(-100,275) A4(-50,275) A5(0,275) A6(50,275) A7(100,275) A8(150,275) A9(200,275) B1(-200,225) B2(-150,225) B3(-100,225) B4(-50,225) B5(0,225) B6(50,225) B7(100,225) B8(150,225) B9(200,225) C1(-200,175) C2(-150,175) C3(-100,175) C4(-50,175) C5(0,175) C6(50,175) C7(100,175) C8(150,175) C9(200,175) D1(-200,125) D2(-150,125) D3(-100,125) D4(-50,125) D5(0,125) D6(50,125) D7(100,125) D8(150,125) D9(200,125) E1(-200,75) E2(-150,75) E3(-100,75) E4(-50,75) E5(0,75) E6(50,75) E7(100,75) E8(150,75) E9(200,75) F1(-200,25) F2(-150,25) F3(-100,25) F4(-50,25) F5(0,25) F6(50,25) F7(100,25) F8(150,25) F9(200,25) G1(-200,-25) G2(-150,-25) G3(-100,-25) G4(-50,-25) G5(0,-25) G6(50,-25) G7(100,-25) G8(150,-25) G9(200,-25) H1(-200,-75) H2(-150,-75) H3(-100,-75) H4(-50,-75) H5(0,-75) H6(50,-75) H7(100,-75) H8(150,-75) H9(200,-75) J1(-200,-125) J2(-150,-125) J3(-100,-125) J4(-50,-125) J5(0,-125) J6(50,-125) J7(100,-125) J8(150,-125) J9(200,-125) K1(-200,-175) K2(-150,-175) K3(-100,-175) K4(-50,-175) K5(0,-175) K6(50,-175) K7(100,-175) K8(150,-175) K9(200,-175) L1(-200,-225) L2(-150,-225) L3(-100,-225) L4(-50,-225) L5(0,-225) L6(50,-225) L7(100,-225) L8(150,-225) L9(200,-225) M1(-200,-275) M2(-150,-275) M3(-100,-275) M4(-50,-275) M5(0,-275) M6(50,-275) M7(100,-275) M8(150,-275) M9(200,-275)
Top Overlay:
  circle w19.68: c-250,325 r9.84
  lines w7: -234.25,-314.96 -234.25,287.66 -206.95,314.96 234.25,314.96 234.25,-314.96 -234.25,-314.96
3D body: height 204.72, standoff 27.56, extent -235,-315 235,315
3D body: height 47.24, standoff 0, extent -223.39,-298.51 -176.37,-251.47
3D body: height 47.24, standoff 0, extent -173.39,-298.51 -126.37,-251.47
3D body: height 47.24, standoff 0, extent -123.39,-298.51 -76.37,-251.47
3D body: height 47.24, standoff 0, extent -73.39,-298.51 -26.37,-251.47
3D body: height 47.24, standoff 0, extent -23.39,-298.51 23.63,-251.47
3D body: height 47.24, standoff 0, extent 26.61,-298.51 73.63,-251.47
3D body: height 47.24, standoff 0, extent 76.61,-298.51 123.63,-251.47
3D body: height 47.24, standoff 0, extent 126.61,-298.51 173.63,-251.47
3D body: height 47.24, standoff 0, extent 176.61,-298.51 223.63,-251.47
3D body: height 47.24, standoff 0, extent 176.61,-248.51 223.63,-201.47
3D body: height 47.24, standoff 0, extent 126.61,-248.51 173.63,-201.47
3D body: height 47.24, standoff 0, extent 76.61,-248.51 123.63,-201.47
3D body: height 47.24, standoff 0, extent 26.61,-248.51 73.63,-201.47
3D body: height 47.24, standoff 0, extent -23.39,-248.51 23.63,-201.47
3D body: height 47.24, standoff 0, extent -73.39,-248.51 -26.37,-201.47
3D body: height 47.24, standoff 0, extent -123.39,-248.51 -76.37,-201.47
3D body: height 47.24, standoff 0, extent -173.39,-248.51 -126.37,-201.47
3D body: height 47.24, standoff 0, extent -223.39,-248.52 -176.37,-201.48
3D body: height 47.24, standoff 0, extent 176.61,-198.51 223.63,-151.47
3D body: height 47.24, standoff 0, extent 126.61,-198.51 173.63,-151.47
3D body: height 47.24, standoff 0, extent 76.61,-198.51 123.63,-151.47
3D body: height 47.24, standoff 0, extent 26.61,-198.51 73.63,-151.47
3D body: height 47.24, standoff 0, extent -23.39,-198.51 23.63,-151.47
3D body: height 47.24, standoff 0, extent -73.39,-198.51 -26.37,-151.47
3D body: height 47.24, standoff 0, extent -123.39,-198.51 -76.37,-151.47
3D body: height 47.24, standoff 0, extent -173.39,-198.51 -126.37,-151.47
3D body: height 47.24, standoff 0, extent -223.39,-198.52 -176.37,-151.48
3D body: height 47.24, standoff 0, extent 176.61,-148.51 223.63,-101.47
3D body: height 47.24, standoff 0, extent 126.61,-148.51 173.63,-101.47
3D body: height 47.24, standoff 0, extent 76.61,-148.51 123.63,-101.47
3D body: height 47.24, standoff 0, extent 26.61,-148.51 73.63,-101.47
3D body: height 47.24, standoff 0, extent -23.39,-148.51 23.63,-101.47
3D body: height 47.24, standoff 0, extent -73.39,-148.51 -26.37,-101.47
3D body: height 47.24, standoff 0, extent -123.39,-148.51 -76.37,-101.47
3D body: height 47.24, standoff 0, extent -173.39,-148.51 -126.37,-101.47
3D body: height 47.24, standoff 0, extent -223.39,-148.52 -176.37,-101.48
3D body: height 47.24, standoff 0, extent 176.61,-98.51 223.63,-51.47
3D body: height 47.24, standoff 0, extent 126.61,-98.51 173.63,-51.47
3D body: height 47.24, standoff 0, extent 76.61,-98.51 123.63,-51.47
3D body: height 47.24, standoff 0, extent 26.61,-98.51 73.63,-51.47
3D body: height 47.24, standoff 0, extent -23.39,-98.51 23.63,-51.47
3D body: height 47.24, standoff 0, extent -73.39,-98.51 -26.37,-51.47
3D body: height 47.24, standoff 0, extent -123.39,-98.51 -76.37,-51.47
3D body: height 47.24, standoff 0, extent -173.39,-98.51 -126.37,-51.47
3D body: height 47.24, standoff 0, extent -223.39,-98.52 -176.37,-51.48
3D body: height 47.24, standoff 0, extent 176.61,-48.51 223.63,-1.47
3D body: height 47.24, standoff 0, extent 126.61,-48.51 173.63,-1.47
3D body: height 47.24, standoff 0, extent 76.61,-48.51 123.63,-1.47
3D body: height 47.24, standoff 0, extent 26.61,-48.51 73.63,-1.47
3D body: height 47.24, standoff 0, extent -23.39,-48.51 23.63,-1.47
3D body: height 47.24, standoff 0, extent -73.39,-48.51 -26.37,-1.47
3D body: height 47.24, standoff 0, extent -123.39,-48.51 -76.37,-1.47
3D body: height 47.24, standoff 0, extent -173.39,-48.51 -126.37,-1.47
3D body: height 47.24, standoff 0, extent -223.39,-48.52 -176.37,-1.48
3D body: height 47.24, standoff 0, extent 176.61,1.49 223.63,48.53
3D body: height 47.24, standoff 0, extent 126.61,1.49 173.63,48.53
3D body: height 47.24, standoff 0, extent 76.61,1.49 123.63,48.53
3D body: height 47.24, standoff 0, extent 26.61,1.49 73.63,48.53
3D body: height 47.24, standoff 0, extent -23.39,1.49 23.63,48.53
3D body: height 47.24, standoff 0, extent -73.39,1.49 -26.37,48.53
3D body: height 47.24, standoff 0, extent -123.39,1.49 -76.37,48.53
3D body: height 47.24, standoff 0, extent -173.39,1.49 -126.37,48.53
3D body: height 47.24, standoff 0, extent -223.39,1.48 -176.37,48.52
3D body: height 47.24, standoff 0, extent 176.61,51.49 223.63,98.53
3D body: height 47.24, standoff 0, extent 126.61,51.49 173.63,98.53
3D body: height 47.24, standoff 0, extent 76.61,51.49 123.63,98.53
3D body: height 47.24, standoff 0, extent 26.61,51.49 73.63,98.53
3D body: height 47.24, standoff 0, extent -23.39,51.49 23.63,98.53
3D body: height 47.24, standoff 0, extent -73.39,51.49 -26.37,98.53
3D body: height 47.24, standoff 0, extent -123.39,51.49 -76.37,98.53
3D body: height 47.24, standoff 0, extent -173.39,51.49 -126.37,98.53
3D body: height 47.24, standoff 0, extent -223.39,51.48 -176.37,98.52
3D body: height 47.24, standoff 0, extent 176.61,101.49 223.63,148.53
3D body: height 47.24, standoff 0, extent 126.61,101.49 173.63,148.53
3D body: height 47.24, standoff 0, extent 76.61,101.49 123.63,148.53
3D body: height 47.24, standoff 0, extent 26.61,101.49 73.63,148.53
3D body: height 47.24, standoff 0, extent -23.39,101.49 23.63,148.53
3D body: height 47.24, standoff 0, extent -73.39,101.49 -26.37,148.53
3D body: height 47.24, standoff 0, extent -123.39,101.49 -76.37,148.53
3D body: height 47.24, standoff 0, extent -173.39,101.49 -126.37,148.53
3D body: height 47.24, standoff 0, extent -223.39,101.48 -176.37,148.52
3D body: height 47.24, standoff 0, extent 176.61,151.49 223.63,198.53
3D body: height 47.24, standoff 0, extent 126.61,151.49 173.63,198.53
3D body: height 47.24, standoff 0, extent 76.61,151.49 123.63,198.53
3D body: height 47.24, standoff 0, extent 26.61,151.49 73.63,198.53
3D body: height 47.24, standoff 0, extent -23.39,151.49 23.63,198.53
3D body: height 47.24, standoff 0, extent -73.39,151.49 -26.37,198.53
3D body: height 47.24, standoff 0, extent -123.39,151.49 -76.37,198.53
3D body: height 47.24, standoff 0, extent -173.39,151.49 -126.37,198.53
3D body: height 47.24, standoff 0, extent -223.39,151.48 -176.37,198.52
3D body: height 47.24, standoff 0, extent 176.61,201.49 223.63,248.53
3D body: height 47.24, standoff 0, extent 126.61,201.49 173.63,248.53
3D body: height 47.24, standoff 0, extent 76.61,201.49 123.63,248.53
3D body: height 47.24, standoff 0, extent 26.61,201.49 73.63,248.53
3D body: height 47.24, standoff 0, extent -23.39,201.49 23.63,248.53
3D body: height 47.24, standoff 0, extent -73.39,201.49 -26.37,248.53
3D body: height 47.24, standoff 0, extent -123.39,201.49 -76.37,248.53
3D body: height 47.24, standoff 0, extent -173.39,201.49 -126.37,248.53
3D body: height 47.24, standoff 0, extent -223.39,201.48 -176.37,248.52
3D body: height 47.24, standoff 0, extent 176.61,251.49 223.63,298.53
3D body: height 47.24, standoff 0, extent 126.61,251.49 173.63,298.53
3D body: height 47.24, standoff 0, extent 76.61,251.49 123.63,298.53
3D body: height 47.24, standoff 0, extent 26.61,251.49 73.63,298.53
3D body: height 47.24, standoff 0, extent -23.39,251.49 23.63,298.53
3D body: height 47.24, standoff 0, extent -73.39,251.49 -26.37,298.53
3D body: height 47.24, standoff 0, extent -123.39,251.49 -76.37,298.53
3D body: height 47.24, standoff 0, extent -173.39,251.49 -126.37,298.53
3D body: height 47.24, standoff 0, extent -223.39,251.48 -176.37,298.52

## LTM8073-BGA [mm]
pads (48):
  round 0.61 smd: A1(-2.5,3.5) A2(-1.5,3.5) A3(-0.5,3.5) A4(0.5,3.5) A5(1.5,3.5) A6(2.5,3.5) B1(-2.5,2.5) B2(-1.5,2.5) B3(-0.5,2.5) B4(0.5,2.5) B5(1.5,2.5) B6(2.5,2.5) C1(-2.5,1.5) C2(-1.5,1.5) C3(-0.5,1.5) C4(0.5,1.5) C5(1.5,1.5) C6(2.5,1.5) D1(-2.5,0.5) D2(-1.5,0.5) D3(-0.5,0.5) D4(0.5,0.5) D5(1.5,0.5) D6(2.5,0.5) E1(-2.5,-0.5) E2(-1.5,-0.5) E3(-0.5,-0.5) E4(0.5,-0.5) E5(1.5,-0.5) E6(2.5,-0.5) F1(-2.5,-1.5) F2(-1.5,-1.5) F3(-0.5,-1.5) F4(0.5,-1.5) F5(1.5,-1.5) F6(2.5,-1.5) G1(-2.5,-2.5) G2(-1.5,-2.5) G3(-0.5,-2.5) G4(0.5,-2.5) G5(1.5,-2.5) G6(2.5,-2.5) H1(-2.5,-3.5) H2(-1.5,-3.5) H3(-0.5,-3.5) H4(0.5,-3.5) H5(1.5,-3.5) H6(2.5,-3.5)
Top Overlay:
  lines w0.203: -3.625,-5 3.625,-5 3.625,5 -3,5 -3.625,4.375 -3.625,-5
Mechanical 1:
  circle w0.254: c-3.8,5.2 r0.539
Mechanical 16:
  circle w0.254: c-3.8,5.2 r0.566
  lines w0.127: -3.125,-4.5 3.125,-4.5 3.125,4.5 -3.125,4.5 -3.125,-4.5
3D body: height 3.32, standoff 0, extent -3.125,-4.5 3.125,4.5

## M3 Screw + Spacer [mm] "M3mmx10mm Screw + 10mm Spacer"
height 10
pads (1):
  round 4 hole 3.2: 0(0,0)
3D body "NORDEX-DJS-M3-10.step": height 1.65, standoff -7.65, extent -1.9,-1.9 1.9,1.9
3D body "M3x10 distancer.step": height -1, standoff -11, extent -2.5,-2.874 2.5,2.9

## M3 WIDE Screw + Spacer [mm] "M3mmx10mm Screw + 10mm Spacer"
height 10
pads (1):
  round 8 hole 3.2: 0(0,0)
3D body "NORDEX-DJS-M3-10.step": height 1.65, standoff -7.65, extent -1.9,-1.9 1.9,1.9
3D body "M3x10 distancer.step": height -1, standoff -11, extent -2.5,-2.874 2.5,2.9